# Altium footprint library My Library.PcbLib: 872 footprints (part 52 of 55)
Each footprint in its own frame and in the unit in brackets; x right, y up, seen from the top. Pads: shape width x height; smd on the part's side, far side on the other; paste and mask are expansions set on the pad; w line width, h text height; cw(c..) or ccw(c..) is an arc to the next point about the centre after c.
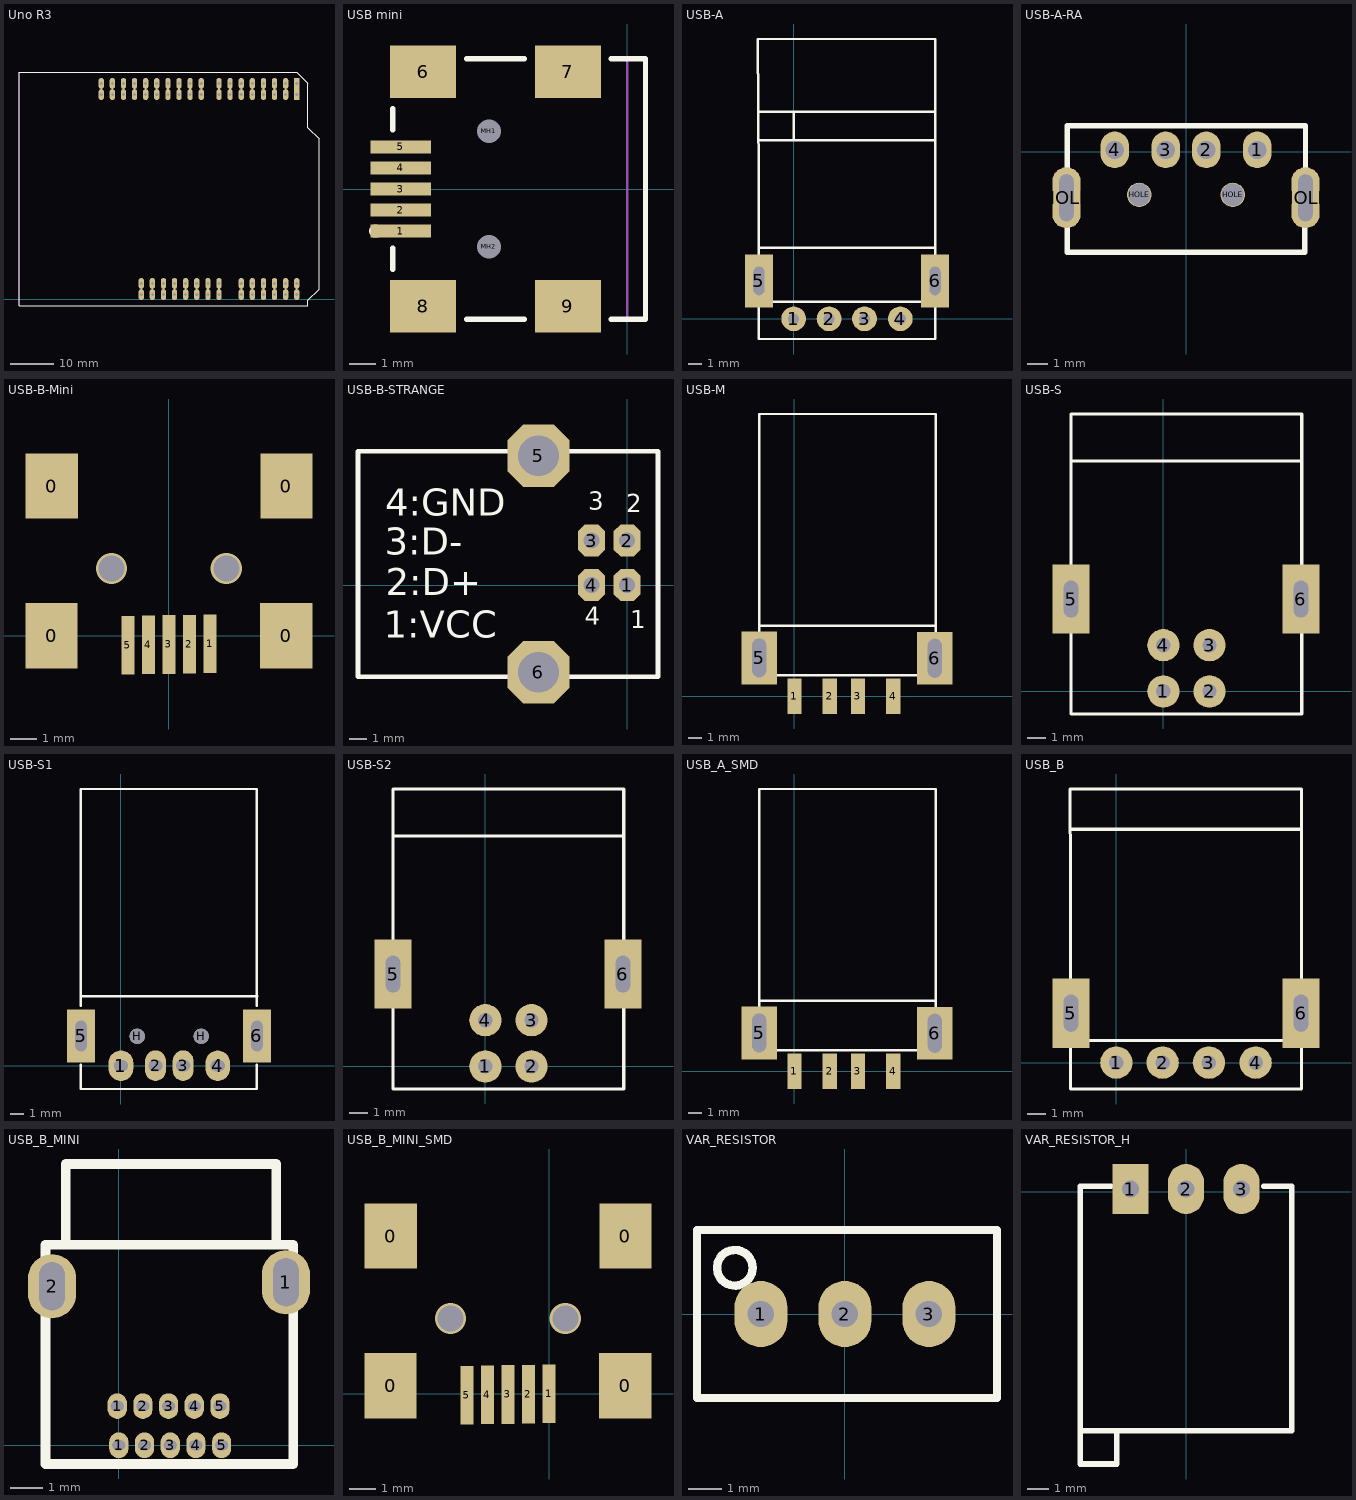
[diagram p51: the footprints below, top view; thin cyan lines are the x and y axes]

## Uno R3 [mm] "Arduino Uno"
pads (64):
  rect 1.2x2.5 hole 0.7: 1(77.851,46.736) 1(77.851,49.276)
  oval 1.2x2.5 hole 0.7: 2(75.311,46.736) 2(75.311,49.276) 3(72.771,46.736) 3(72.771,49.276) 4(70.231,46.736) 4(70.231,49.276) 5(67.691,46.736) 5(67.691,49.276) 6(65.151,46.736) 6(65.151,49.276) 7(62.611,46.736) 7(62.611,49.276) 8(60.071,46.736) 8(60.071,49.276) 9(56.007,46.736) 9(56.007,49.276) 10(53.467,46.736) 10(53.467,49.276) 11(50.927,46.736) 11(50.927,49.276) 12(48.387,46.736) 12(48.387,49.276) 13(45.847,46.736) 13(45.847,49.276) 14(43.307,46.736) 14(43.307,49.276) 15(40.767,46.736) 15(40.767,49.276) 16(38.227,46.736) 16(38.227,49.276) 17(35.687,46.736) 17(35.687,49.276) 18(33.147,46.736) 18(33.147,49.276) 19(65.151,1.016) 19(65.151,3.556) 20(67.691,1.016) 20(67.691,3.556) 21(70.231,1.016) 21(70.231,3.556) 22(72.771,1.016) 22(72.771,3.556) 23(75.311,1.016) 23(75.311,3.556) 24(77.851,1.016) 24(77.851,3.556) 25(42.291,1.016) 25(42.291,3.556) 26(44.831,1.016) 26(44.831,3.556) 27(47.371,1.016) 27(47.371,3.556) 28(49.911,1.016) 28(49.911,3.556) 29(52.451,1.016) 29(52.451,3.556) 30(54.991,1.016) 30(54.991,3.556) 31(57.531,1.016) 31(57.531,3.556) 32(60.071,1.016) 32(60.071,3.556)
Top Overlay:
  lines w0.254: 14.351,-1.524 14.351,51.816 77.851,51.816 80.391,49.276 80.391,39.116 82.931,36.576 82.931,2.286 80.391,-0.254 80.391,-1.524 14.351,-1.524
Mechanical 1:
  lines w0.013: 14.351,-1.524 14.351,51.816
3D body "User Library-Arduino Uno-1.step": height 22.7, standoff 10, extent 7.327,-2.112 82.677,51.388

## USB mini [mm] "Connector; USB2.0, Type B, SM; 5 Position; Right Angle"
height 3.9
pads (11):
  rect 2.3x0.5 smd: 1(-8.6,-1.6) 2(-8.6,-0.8) 3(-8.6,0) 4(-8.6,0.8) 5(-8.6,1.6)
  rect 2.5x2 smd: 6(-7.75,4.45) 7(-2.25,4.45) 8(-7.75,-4.45) 9(-2.25,-4.45)
  round 0.6 hole 0.9 unplated: MH1(-5.25,2.2) MH2(-5.25,-2.2)
Top Overlay:
  circle w0.25: c-9.55,-1.6 r0.125
  lines w0.2: -8.9,-3.05 -8.9,-2.25 ; -8.9,2.25 -8.9,3.05 ; -6.1,-4.95 -3.9,-4.95 ; -6.1,4.95 -3.9,4.95 ; -0.6,-4.95 0.7,-4.95 0.7,4.95 -0.6,4.95
Mechanical 1:
  lines w0.1: 0,-4.95 0,4.95
  text "PCB Edge" at 0.432,-4.036 h0.25
3D body "SW3dPS-USB_mini_B.STEP": height 3.97, standoff -0.98, extent -8.558,-5.35 0.642,5.35

## USB-A [mil]
pads (6):
  round 70 hole 31: 1(0,0) 2(100,0) 3(200,0) 4(301,0)
  rect 80x150 hole 31 slot 80 at 90 deg: 5(-98,107) 6(399,107)
Top Overlay:
  lines w7: -99,200 400,200 ; -99,504 400,504 ; -99,584 400,584 ; -98,48 401,48 ; 0,504 0,584 ; -101.03,790 400,790 400,-57 -99,-57 -99,397 -101.03,790
3D body "usb_a-usb_a-lp-c.stp": height 177.17, standoff -51.16, extent -97.29,-0.22 399,784.22

## USB-A-RA [mm] "USB Type A"
pads (8):
  oval 1.4x1.8 hole 0.9: 1(3.5,0.08) 2(1,0.08) 3(-1,0.08) 4(-3.5,0.08)
  oval 1.4x3 hole 0.7 slot 2.3 at 90 deg: HOLE(-5.875,-2.27) HOLE(5.875,-2.27)
  round 1.2 hole 1.1: HOLE(-2.3,-2.13) HOLE(2.3,-2.13)
Top Overlay:
  lines w0.254: 5.842,-2.27 5.842,-4.953 -5.842,-4.953 -5.842,1.27 5.875,1.27 5.875,-2.27
Keep-Out Layer:
  lines w0.254: 5.842,-2.27 5.875,-2.27
3D body "Samtec-USB-AM-S-F-B-TH-FlashDrive.step": height 2.18, standoff -3.52, extent -6.25,-19.8 6.25,0.23

## USB-B-Mini [mm]
pads (9):
  rect 2x2.5 smd: 0(-4.5,0) 0(-4.496,5.74) 0(4.5,0) 0(4.504,5.74)
  rect 0.5x2.25 smd: 1(1.575,-0.305) 2(0.787,-0.318) 3(0,-0.33) 4(-0.787,-0.343) 5(-1.575,-0.356)
via 2.2,2.58 diameter 1.2 hole 1
via -2.2,2.58 diameter 1.2 hole 1
3D body "User Library-USB_mini_B.step": height 3.95, standoff -1, extent -5.35,-0.673 5.35,8.527

## USB-B-STRANGE [mm] "USB Type B - STRANGE - Slave Device"
pads (6):
  oct 1.5x1.8 hole 0.9: 1(0,0) 2(0,2.5) 3(-2,2.5) 4(-2,0)
  oct 3.5x3.5 hole 2.3: 5(-4.988,7.283) 6(-4.988,-4.909)
Top Overlay:
  lines w0.254: -15.148,-5.163 -15.148,7.537 1.743,7.537 1.743,-5.163 -15.148,-5.163
  text "1:VCC" at -13.701,-2.978 h1.52
  text "2:D+" at -13.574,-0.565 h1.52
  text "3:D-" at -13.65,1.695 h1.52
  text "4:GND" at -13.624,3.905 h1.52
  text "1" at 0.193,-2.42 h1
  text "3" at -2.194,4.235 h1
  text "2" at -0.035,4.108 h1
  text "4" at -2.372,-2.242 h1
3D body "Samtec-USB-B-S-F-B-TH-Strange.step": height 10.98, standoff -3.24, extent -15.45,-6.179 0.85,8.68

## USB-M [mil] "For USB SMD"
height 150
pads (6):
  rect 40x100 smd: 1(0,0) 2(100,0) 3(180,0) 4(280,0)
  rect 100x150 hole 40 slot 110 at 90 deg: 5(-100,109) 6(398,108)
Top Overlay:
  lines w7: -100,200 400,200 ; -100,60 -100,800 400,800 400,60 -100,60
3D body "User Library-USB Series A Plug.step": height 177.77, standoff 0.6, extent -88.44,27.17 384,748.83

## USB-S [mil] "USB B connector, 4pin, For Print"
height 100
pads (6):
  round 70 hole 31: 1(0,0) 2(100,0) 3(100,100) 4(0,100)
  rect 80x150 hole 31 slot 80 at 90 deg: 5(-200,200) 6(298,200)
Top Overlay:
  lines w7: -200,499 300,499 ; -200,-49 -200,601 300,601 300,-49 -200,-49
3D body "usb_a-usbsb.stp": height 421.26, standoff -155.51, extent -243.31,-39.61 343.31,610

## USB-S1 [mm] "USB A connector, 4pin, For USB sing"
height 2.54
pads (8):
  oval 1.778x2.2 hole 0.8 slot 1 at 0 deg: 1(0,0) 4(6.96,0)
  oval 1.5x2.2 hole 0.8 slot 1 at 0 deg: 2(2.489,0) 3(4.47,0)
  rect 2.032x3.81 hole 0.8 slot 2.2 at 90 deg: 5(-2.87,2.134) 6(9.779,2.134)
  round 1.1 hole 1.1: H(1.168,2.108) H(5.766,2.108)
Top Overlay:
  lines w0.178: -2.896,0.051 -2.896,-1.676 9.779,-1.676 9.779,0.051 ; -2.896,4.293 -2.896,19.888 9.779,19.888 9.779,4.293 ; -2.87,5.004 9.804,5.004
3D body "usb_a-usb_a-lp-c.stp": height 3.3, standoff -2.5, extent -2.827,-0.133 9.779,19.792

## USB-S2 [mil] "USB B connector, 4pin, For Print"
height 100
pads (6):
  round 70 hole 31: 1(0,0) 2(100,0) 3(100,100) 4(0,100)
  rect 80x150 hole 31 slot 80 at 90 deg: 5(-200,200) 6(298,200)
Top Overlay:
  lines w7: -200,499 300,499 ; -200,-49 -200,601 300,601 300,-49 -200,-49
3D body "Samtec3dPS-USBR-B.STEP": height 446.54, standoff -132.99, extent -247.29,-42 339.29,599.73

## USB_A_SMD [mil] "For USB SMD"
height 150
pads (6):
  rect 40x100 smd: 1(0,0) 2(100,0) 3(180,0) 4(280,0)
  rect 100x150 hole 40 slot 110 at 90 deg: 5(-100,109) 6(398,108)
Top Overlay:
  lines w7: -100,200 400,200 ; -100,60 400,60 400,800 -100,800 -100,60
3D body "SW3dPS-USB Series A Plug.STEP": height 73.83, standoff -103.33, extent -93.44,62.17 379,783.83

## USB_B [mil] "USB A connector, 4pin, For USB sing"
height 100
pads (6):
  round 70 hole 31: 1(0,0) 2(100,0) 3(200,0) 4(301,0)
  rect 80x150 hole 31 slot 80 at 90 deg: 5(-98,107) 6(399,107)
Top Overlay:
  lines w7: -99,504 400,504 ; -98,48 401,48 ; -100,591 400,591 400,-57 -99,-57 -99,397 -100,591
3D body "usb_a-usbsa.stp": height 277.51, standoff -149.84, extent -162.02,-58 460.02,512.87

## USB_B_MINI [mm]
pads (12):
  oval 0.6x0.8 hole 0.3 slot 0.4 at 0 deg: 1(-0.051,1.219) 1(0,0) 2(0.749,1.219) 2(0.8,0) 3(1.549,1.219) 3(1.6,0) 4(2.349,1.219) 4(2.4,0) 5(3.149,1.219) 5(3.2,0)
  oval 1.5x2 hole 0.8 slot 1.5 at 90 deg: 1(5.207,5.08) 2(-2.083,4.953)
Top Overlay:
  lines w0.3: -1.651,6.299 -1.651,8.763 4.902,8.763 4.902,6.35 ; -2.286,-0.584 -2.286,6.248 5.436,6.248 5.436,-0.584 -2.286,-0.584
3D body "usb_b_mini_dip.stp": height 3.92, standoff -1.68, extent -2.266,-0.561 5.436,8.791

## USB_B_MINI_SMD [mm]
pads (9):
  rect 2x2.5 smd: 0(-6.075,0.305) 0(-6.071,6.045) 0(2.925,0.305) 0(2.929,6.045)
  rect 0.5x2.25 smd: 1(0,0) 2(-0.787,-0.013) 3(-1.575,-0.025) 4(-2.362,-0.038) 5(-3.15,-0.051)
via -3.775,2.885 diameter 1.2 hole 1
via 0.625,2.885 diameter 1.2 hole 1
3D body "User Library-USB_mini_B.step": height 3.95, standoff -1, extent -6.925,-0.368 3.775,8.832

## VAR_RESISTOR [mm]
pads (3):
  oval 1.6x2 hole 0.8: 1(-2.54,0) 2(0,0) 3(2.54,0)
Top Overlay:
  circle w0.254: c-3.327,1.397 r0.539
  lines w0.254: -4.47,-2.54 -4.47,2.54 4.597,2.54 4.597,-2.54 -4.47,-2.54
3D body "User Library-Potenciometro Vertical.step": height 12.02, standoff -5.48, extent -4.537,-2.4 4.663,2.4

## VAR_RESISTOR_H [mil]
pads (3):
  rect 65x90 hole 30: 1(-100,5)
  oval 65x90 hole 30: 2(0,5) 3(100,5)
Top Overlay:
  lines w10: -190,-455 -190,10 -135,10 ; -125,-430 -125,-490 -190,-490 -190,-430 190,-430 190,10 140,10
3D body "SW3dPS-Bourns_3299W.STEP": height 242.13, standoff 2.13, extent -187.5,-490 187.5,10